# Altium footprint library ICs And Semiconductors SMD.PcbLib: 602 footprints (part 27 of 38)
Each footprint in its own frame and in the unit in brackets; x right, y up, seen from the top. Pads: shape width x height; smd on the part's side, far side on the other; paste and mask are expansions set on the pad; w line width, h text height; cw(c..) or ccw(c..) is an arc to the next point about the centre after c.
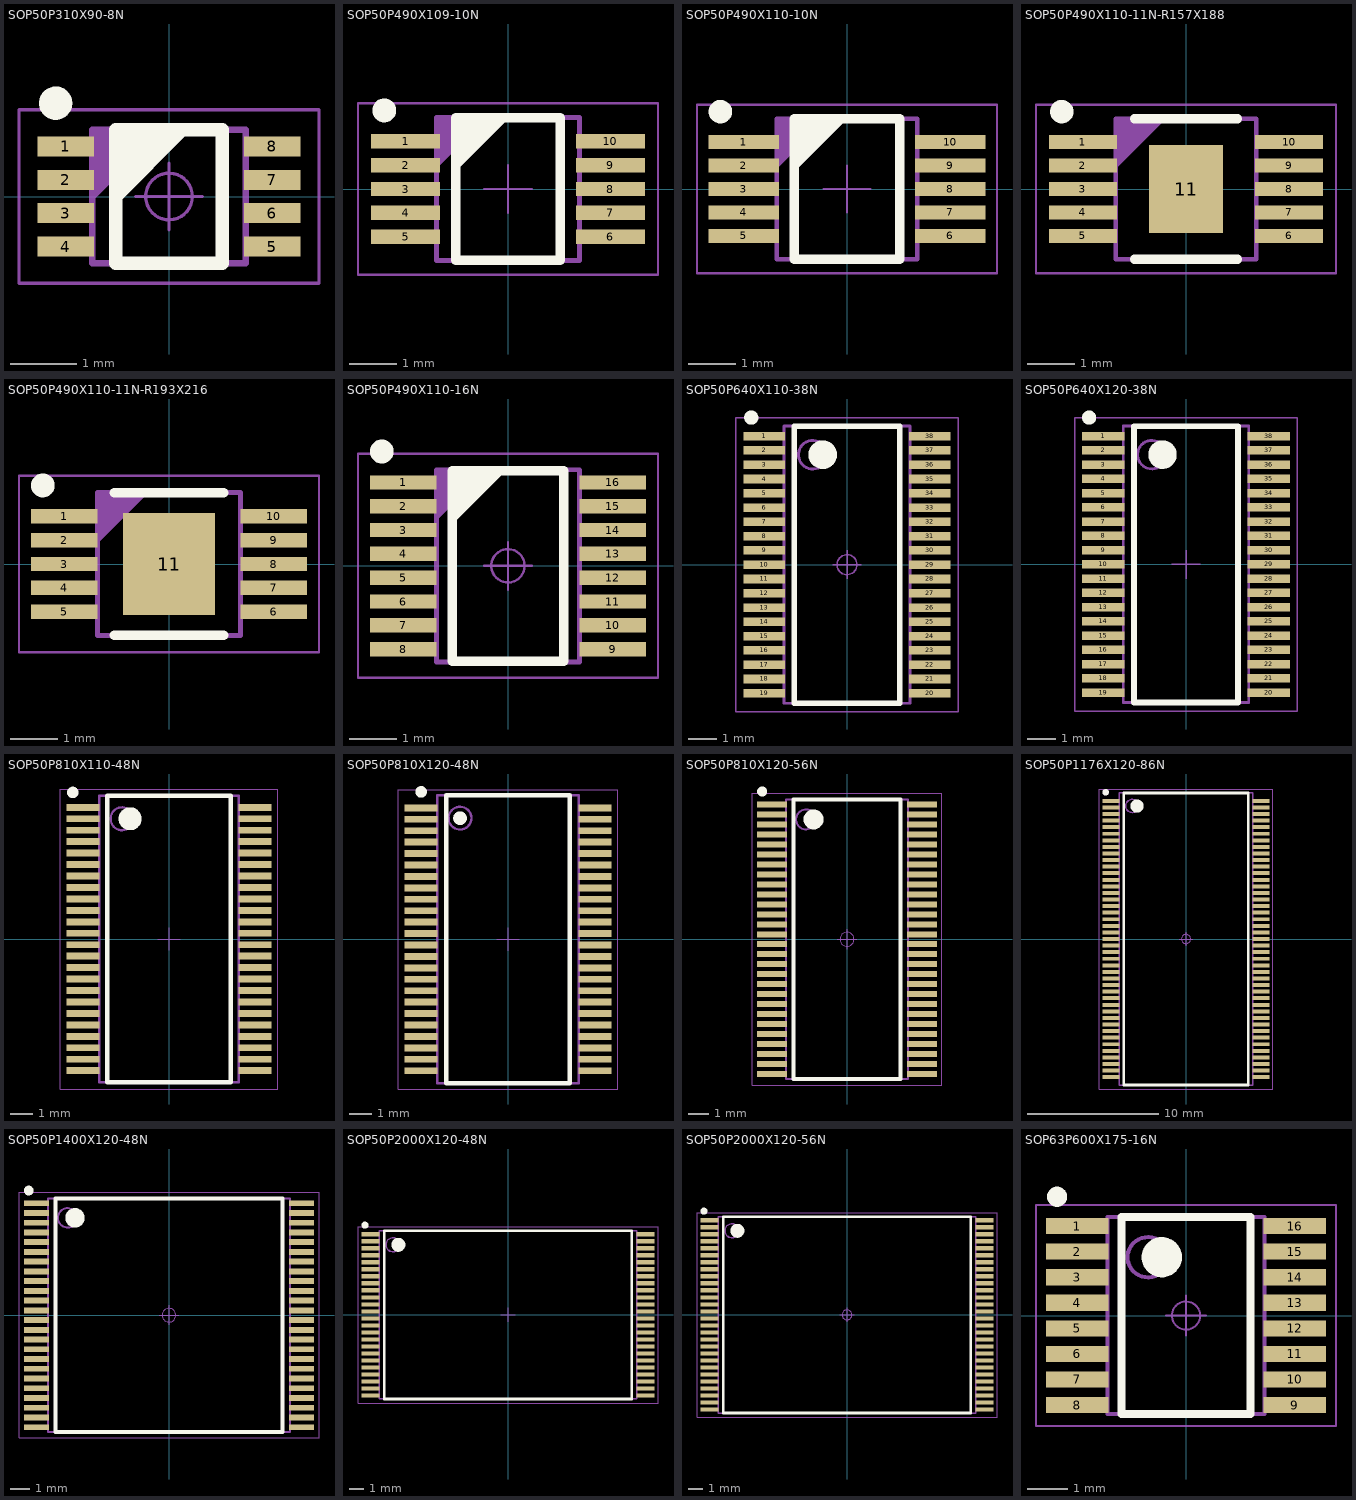
[diagram p26: the footprints below, top view; thin cyan lines are the x and y axes]

## SOP50P310X90-8N [mm] "SOP, 0.50mm pitch; 8 pin, 2.30mm W X 2.00mm L X 0.90mm H body, PC Medium Density"
height 0.9
pads (8):
  rect 0.85x0.3 smd: 1(-1.55,0.75) 2(-1.55,0.25) 3(-1.55,-0.25) 4(-1.55,-0.75) 5(1.55,-0.75) 6(1.55,-0.25) 7(1.55,0.25) 8(1.55,0.75)
Top Overlay:
  circle w0.25: c-1.7,1.4 r0.125
  lines w0.2: -0.8,0 0.2,1 ; -0.8,0.2 0,1 ; -0.8,0.4 -0.2,1 ; -0.8,0.6 -0.4,1 ; -0.8,0.8 -0.6,1 ; -0.8,-1 -0.8,1 0.8,1 0.8,-1 -0.8,-1
Mechanical 14:
  lines w0.1: -1.15,0 -0.15,1 ; -1.15,0.1 -0.25,1 ; -1.15,0.2 -0.35,1 ; -1.15,0.3 -0.45,1 ; -1.15,0.4 -0.55,1 ; -1.15,0.5 -0.65,1 ; -1.15,0.6 -0.75,1 ; -1.15,0.7 -0.85,1 ; -1.15,0.8 -0.95,1 ; -1.15,0.9 -1.05,1 ; -1.15,-1 -1.15,1 1.15,1 1.15,-1 -1.15,-1
Mechanical 15:
  circle w0.05: c0,0 r0.35
  lines w0.05: -0.5,0 0.5,0 ; 0,-0.5 0,0.5 ; -2.25,-1.3 -2.25,1.3 2.25,1.3 2.25,-1.3 -2.25,-1.3
3D body "SOP50P310X90-8N.stp": height 0.9, standoff 0, extent -1.616,-1 1.616,1

## SOP50P490X109-10N [mm] "SOP, 0.50mm pitch; 10 pin, 3.00mm W X 3.00mm L X 1.09mm H body, IPC Medium Density"
height 1.09
pads (10):
  rect 1.45x0.3 smd: 1(-2.15,1) 2(-2.15,0.5) 3(-2.15,0) 4(-2.15,-0.5) 5(-2.15,-1) 6(2.15,-1) 7(2.15,-0.5) 8(2.15,0) 9(2.15,0.5) 10(2.15,1)
Top Overlay:
  circle w0.25: c-2.6,1.65 r0.125
  lines w0.2: -1.1,0.5 -0.1,1.5 ; -1.1,0.7 -0.3,1.5 ; -1.1,0.9 -0.5,1.5 ; -1.1,1.1 -0.7,1.5 ; -1.1,1.3 -0.9,1.5 ; -1.1,-1.5 -1.1,1.5 1.1,1.5 1.1,-1.5 -1.1,-1.5
Mechanical 14:
  lines w0.1: -1.5,0.5 -0.5,1.5 ; -1.5,0.6 -0.6,1.5 ; -1.5,0.7 -0.7,1.5 ; -1.5,0.8 -0.8,1.5 ; -1.5,0.9 -0.9,1.5 ; -1.5,1 -1,1.5 ; -1.5,1.1 -1.1,1.5 ; -1.5,1.2 -1.2,1.5 ; -1.5,1.3 -1.3,1.5 ; -1.5,1.4 -1.4,1.5 ; -1.5,-1.5 -1.5,1.5 1.5,1.5 1.5,-1.5 -1.5,-1.5
Mechanical 15:
  lines w0.05: -0.5,0 0.5,0 ; 0,-0.5 0,0.5 ; -3.15,-1.8 3.15,-1.8 3.15,1.8 -3.15,1.8 -3.15,-1.8
3D body "SOP50P490X109-10N.stp": height 1.09, standoff 0, extent -2.45,-1.55 2.45,1.55

## SOP50P490X110-10N [mm] "TSSOP, 10-Leads, Body 3x3mm (max), Pitch 0.50mm, IPC Medium Density"
height 1.1
pads (10):
  rect 1.5x0.3 smd: 1(-2.2,1) 2(-2.2,0.5) 3(-2.2,0) 4(-2.2,-0.5) 5(-2.2,-1) 6(2.2,-1) 7(2.2,-0.5) 8(2.2,0) 9(2.2,0.5) 10(2.2,1)
Top Overlay:
  circle w0.25: c-2.7,1.65 r0.125
  lines w0.2: -1.125,0.5 -0.125,1.5 ; -1.125,0.7 -0.325,1.5 ; -1.125,0.9 -0.525,1.5 ; -1.125,1.1 -0.725,1.5 ; -1.125,1.3 -0.925,1.5 ; -1.125,-1.5 -1.125,1.5 1.125,1.5 1.125,-1.5 -1.125,-1.5
Mechanical 14:
  lines w0.1: -1.5,0.5 -0.5,1.5 ; -1.5,0.6 -0.6,1.5 ; -1.5,0.7 -0.7,1.5 ; -1.5,0.8 -0.8,1.5 ; -1.5,0.9 -0.9,1.5 ; -1.5,1 -1,1.5 ; -1.5,1.1 -1.1,1.5 ; -1.5,1.2 -1.2,1.5 ; -1.5,1.3 -1.3,1.5 ; -1.5,1.4 -1.4,1.5 ; -1.5,-1.5 -1.5,1.5 1.5,1.5 1.5,-1.5 -1.5,-1.5
Mechanical 15:
  lines w0.05: -0.5,0 0.5,0 ; 0,-0.5 0,0.5 ; -3.2,-1.8 3.2,-1.8 3.2,1.8 -3.2,1.8 -3.2,-1.8
3D body "SOP50P490X110-10N.stp": height 1.1, standoff 0, extent -2.45,-1.55 2.45,1.55

## SOP50P490X110-11N-R157X188 [mm] "SOP, 0.50mm, pitch; 10 pin, 3.00mm W X 3.00mm L X 1.10mm H body (w/thermal tab  1.57 X 1.88 mm), IPC Medium Density"
height 1.1
pads (11):
  rect 1.45x0.3 smd: 1(-2.2,1) 2(-2.2,0.5) 3(-2.2,0) 4(-2.2,-0.5) 5(-2.2,-1) 6(2.2,-1) 7(2.2,-0.5) 8(2.2,0) 9(2.2,0.5) 10(2.2,1)
  rect 1.57x1.88 smd: 11(0,0)
Top Overlay:
  circle w0.25: c-2.65,1.65 r0.125
  lines w0.2: -1.1,-1.5 1.1,-1.5 ; -1.1,1.5 1.1,1.5
Mechanical 14:
  lines w0.1: -1.5,0.5 -0.5,1.5 ; -1.5,0.6 -0.6,1.5 ; -1.5,0.7 -0.7,1.5 ; -1.5,0.8 -0.8,1.5 ; -1.5,0.9 -0.9,1.5 ; -1.5,1 -1,1.5 ; -1.5,1.1 -1.1,1.5 ; -1.5,1.2 -1.2,1.5 ; -1.5,1.3 -1.3,1.5 ; -1.5,1.4 -1.4,1.5 ; -1.5,-1.5 1.5,-1.5 1.5,1.5 -1.5,1.5 -1.5,-1.5
Mechanical 15:
  circle w0.05: c0,0 r0.35
  lines w0.05: -0.5,0 0.5,0 ; 0,-0.5 0,0.5 ; -3.2,-1.8 -3.2,1.8 3.2,1.8 3.2,-1.8 -3.2,-1.8
3D body "SOP50P490X110-11N-R155X185.stp": height 1.1, standoff 0, extent -2.45,-1.55 2.45,1.55

## SOP50P490X110-11N-R193X216 [mm] "SOP, 0.50mm, Pitch; 10 Pin, 3.00mm W X 3.00mm L X 1.10mm H Body (w/Thermal Tab  1.93 X 2.16 mm), IPC Medium Density"
height 1.1
pads (11):
  rect 1.4x0.3 smd: 1(-2.2,1) 2(-2.2,0.5) 3(-2.2,0) 4(-2.2,-0.5) 5(-2.2,-1) 6(2.2,-1) 7(2.2,-0.5) 8(2.2,0) 9(2.2,0.5) 10(2.2,1)
  rect 1.93x2.15 smd: 11(0,0)
Top Overlay:
  circle w0.25: c-2.65,1.65 r0.125
  lines w0.2: -1.15,-1.5 1.15,-1.5 ; -1.15,1.5 1.15,1.5
Mechanical 14:
  lines w0.1: -1.5,0.5 -0.5,1.5 ; -1.5,0.6 -0.6,1.5 ; -1.5,0.7 -0.7,1.5 ; -1.5,0.8 -0.8,1.5 ; -1.5,0.9 -0.9,1.5 ; -1.5,1 -1,1.5 ; -1.5,1.1 -1.1,1.5 ; -1.5,1.2 -1.2,1.5 ; -1.5,1.3 -1.3,1.5 ; -1.5,1.4 -1.4,1.5 ; -1.5,-1.5 -1.5,1.5 1.5,1.5 1.5,-1.5 -1.5,-1.5
Mechanical 15:
  circle w0.05: c0,0 r0.35
  lines w0.05: -0.5,0 0.5,0 ; 0,-0.5 0,0.5 ; -3.15,-1.85 3.15,-1.85 3.15,1.85 -3.15,1.85 -3.15,-1.85
3D body "SOP50P490X110-11N-R193X216.stp": height 1.1, standoff 0, extent -2.45,-1.55 2.45,1.55

## SOP50P490X110-16N [mm] "SOP, 0.50mm Pitch; 16 Pin, 3.00mm W X 4.039mm L X 1.10mm H Body, IPC Medium Density"
height 1.1
pads (16):
  rect 1.4x0.3 smd: 1(-2.2,1.75) 2(-2.2,1.25) 3(-2.2,0.75) 4(-2.2,0.25) 5(-2.2,-0.25) 6(-2.2,-0.75) 7(-2.2,-1.25) 8(-2.2,-1.75) 9(2.2,-1.75) 10(2.2,-1.25) 11(2.2,-0.75) 12(2.2,-0.25) 13(2.2,0.25) 14(2.2,0.75) 15(2.2,1.25) 16(2.2,1.75)
Top Overlay:
  circle w0.25: c-2.65,2.4 r0.125
  lines w0.2: -1.175,1 -0.175,2 ; -1.175,1.2 -0.375,2 ; -1.175,1.4 -0.575,2 ; -1.175,1.6 -0.775,2 ; -1.175,1.8 -0.975,2 ; -1.175,-2 1.175,-2 1.175,2 -1.175,2 -1.175,-2
Mechanical 14:
  lines w0.1: -1.5,1.019 -0.5,2.019 ; -1.5,1.12 -0.6,2.019 ; -1.5,1.219 -0.7,2.019 ; -1.5,1.32 -0.8,2.019 ; -1.5,1.419 -0.9,2.019 ; -1.5,1.519 -1,2.019 ; -1.5,1.62 -1.1,2.019 ; -1.5,1.719 -1.2,2.019 ; -1.5,1.82 -1.3,2.019 ; -1.5,1.919 -1.4,2.019 ; -1.5,-2.019 1.5,-2.019 1.5,2.019 -1.5,2.019 -1.5,-2.019
Mechanical 15:
  circle w0.05: c0,0 r0.35
  lines w0.05: -0.5,0 0.5,0 ; 0,-0.5 0,0.5 ; -3.15,-2.35 3.15,-2.35 3.15,2.35 -3.15,2.35 -3.15,-2.35
3D body "SOP50P490X110-16N.stp": height 1.1, standoff 0, extent -2.466,-2.07 2.466,2.07

## SOP50P640X110-38N [mm] "SOP, 0.50mm Pitch; 38 Pin, 4.40mm W X 9.70mm L X 1.10mm H Body, IPC Medium Density"
height 1.1
pads (38):
  rect 1.45x0.3 smd: 1(-2.9,4.5) 2(-2.9,4) 3(-2.9,3.5) 4(-2.9,3) 5(-2.9,2.5) 6(-2.9,2) 7(-2.9,1.5) 8(-2.9,1) 9(-2.9,0.5) 10(-2.9,0) 11(-2.9,-0.5) 12(-2.9,-1) 13(-2.9,-1.5) 14(-2.9,-2) 15(-2.9,-2.5) 16(-2.9,-3) 17(-2.9,-3.5) 18(-2.9,-4) 19(-2.9,-4.5) 20(2.9,-4.5) 21(2.9,-4) 22(2.9,-3.5) 23(2.9,-3) 24(2.9,-2.5) 25(2.9,-2) 26(2.9,-1.5) 27(2.9,-1) 28(2.9,-0.5) 29(2.9,0) 30(2.9,0.5) 31(2.9,1) 32(2.9,1.5) 33(2.9,2) 34(2.9,2.5) 35(2.9,3) 36(2.9,3.5) 37(2.9,4) 38(2.9,4.5)
Top Overlay:
  circle w0.5: c-0.85,3.85 r0.25
  circle w0.25: c-3.35,5.15 r0.125
  lines w0.2: -1.85,-4.85 1.85,-4.85 1.85,4.85 -1.85,4.85 -1.85,-4.85
Mechanical 14:
  circle w0.1: c-1.2,3.85 r0.5
  lines w0.1: -2.2,-4.85 2.2,-4.85 2.2,4.85 -2.2,4.85 -2.2,-4.85
Mechanical 15:
  circle w0.05: c0,0 r0.35
  lines w0.05: -0.5,0 0.5,0 ; 0,-0.5 0,0.5 ; -3.9,-5.15 3.9,-5.15 3.9,5.15 -3.9,5.15 -3.9,-5.15
3D body "SOP50P640X110-38N.stp": height 1.1, standoff 0, extent -3.319,-4.9 3.32,4.9

## SOP50P640X120-38N [mm] "SOP, 0.50mm pitch; 38 pin, 4.40mm W X 9.70mm L X 1.20mm H body, IPC Medium Density"
height 1.2
pads (38):
  rect 1.5x0.3 smd: 1(-2.9,4.5) 2(-2.9,4) 3(-2.9,3.5) 4(-2.9,3) 5(-2.9,2.5) 6(-2.9,2) 7(-2.9,1.5) 8(-2.9,1) 9(-2.9,0.5) 10(-2.9,0) 11(-2.9,-0.5) 12(-2.9,-1) 13(-2.9,-1.5) 14(-2.9,-2) 15(-2.9,-2.5) 16(-2.9,-3) 17(-2.9,-3.5) 18(-2.9,-4) 19(-2.9,-4.5) 20(2.9,-4.5) 21(2.9,-4) 22(2.9,-3.5) 23(2.9,-3) 24(2.9,-2.5) 25(2.9,-2) 26(2.9,-1.5) 27(2.9,-1) 28(2.9,-0.5) 29(2.9,0) 30(2.9,0.5) 31(2.9,1) 32(2.9,1.5) 33(2.9,2) 34(2.9,2.5) 35(2.9,3) 36(2.9,3.5) 37(2.9,4) 38(2.9,4.5)
Top Overlay:
  circle w0.5: c-0.825,3.85 r0.25
  circle w0.25: c-3.4,5.15 r0.125
  lines w0.2: -1.825,-4.85 1.825,-4.85 1.825,4.85 -1.825,4.85 -1.825,-4.85
Mechanical 14:
  circle w0.1: c-1.2,3.85 r0.5
  lines w0.1: -2.2,-4.85 2.2,-4.85 2.2,4.85 -2.2,4.85 -2.2,-4.85
Mechanical 15:
  lines w0.05: -0.5,0 0.5,0 ; 0,-0.5 0,0.5 ; -3.9,-5.15 3.9,-5.15 3.9,5.15 -3.9,5.15 -3.9,-5.15
3D body "SOP50P640X120-38N.stp": height 1.2, standoff 0, extent -3.32,-4.9 3.32,4.9

## SOP50P810X110-48N [mm] "SOP, 48-Leads, Body 12.5x6.2mm (max), Pitch 0.50mm, IPC Medium Density"
height 1.1
pads (48):
  rect 1.45x0.3 smd: 1(-3.75,5.75) 2(-3.75,5.25) 3(-3.75,4.75) 4(-3.75,4.25) 5(-3.75,3.75) 6(-3.75,3.25) 7(-3.75,2.75) 8(-3.75,2.25) 9(-3.75,1.75) 10(-3.75,1.25) 11(-3.75,0.75) 12(-3.75,0.25) 13(-3.75,-0.25) 14(-3.75,-0.75) 15(-3.75,-1.25) 16(-3.75,-1.75) 17(-3.75,-2.25) 18(-3.75,-2.75) 19(-3.75,-3.25) 20(-3.75,-3.75) 21(-3.75,-4.25) 22(-3.75,-4.75) 23(-3.75,-5.25) 24(-3.75,-5.75) 25(3.75,-5.75) 26(3.75,-5.25) 27(3.75,-4.75) 28(3.75,-4.25) 29(3.75,-3.75) 30(3.75,-3.25) 31(3.75,-2.75) 32(3.75,-2.25) 33(3.75,-1.75) 34(3.75,-1.25) 35(3.75,-0.75) 36(3.75,-0.25) 37(3.75,0.25) 38(3.75,0.75) 39(3.75,1.25) 40(3.75,1.75) 41(3.75,2.25) 42(3.75,2.75) 43(3.75,3.25) 44(3.75,3.75) 45(3.75,4.25) 46(3.75,4.75) 47(3.75,5.25) 48(3.75,5.75)
Top Overlay:
  circle w0.5: c-1.7,5.25 r0.25
  circle w0.25: c-4.2,6.4 r0.125
  lines w0.2: -2.7,-6.25 2.7,-6.25 2.7,6.25 -2.7,6.25 -2.7,-6.25
Mechanical 14:
  circle w0.1: c-2.05,5.25 r0.5
  lines w0.1: -3.05,-6.25 -3.05,6.25 3.05,6.25 3.05,-6.25 -3.05,-6.25
Mechanical 15:
  lines w0.05: -0.5,0 0.5,0 ; 0,-0.5 0,0.5 ; -4.75,-6.55 -4.75,6.55 4.75,6.55 4.75,-6.55 -4.75,-6.55
3D body "SOP50P810X110-48N.stp": height 1.1, standoff 0, extent -4.06,-6.3 4.061,6.3

## SOP50P810X120-48N [mm] "SOP, 48-Leads, Body 12.6x6.2mm (max), Pitch 0.50mm, IPC Medium Density"
height 1.2
pads (48):
  rect 1.45x0.3 smd: 1(-3.8,5.75) 2(-3.8,5.25) 3(-3.8,4.75) 4(-3.8,4.25) 5(-3.8,3.75) 6(-3.8,3.25) 7(-3.8,2.75) 8(-3.8,2.25) 9(-3.8,1.75) 10(-3.8,1.25) 11(-3.8,0.75) 12(-3.8,0.25) 13(-3.8,-0.25) 14(-3.8,-0.75) 15(-3.8,-1.25) 16(-3.8,-1.75) 17(-3.8,-2.25) 18(-3.8,-2.75) 19(-3.8,-3.25) 20(-3.8,-3.75) 21(-3.8,-4.25) 22(-3.8,-4.75) 23(-3.8,-5.25) 24(-3.8,-5.75) 25(3.8,-5.75) 26(3.8,-5.25) 27(3.8,-4.75) 28(3.8,-4.25) 29(3.8,-3.75) 30(3.8,-3.25) 31(3.8,-2.75) 32(3.8,-2.25) 33(3.8,-1.75) 34(3.8,-1.25) 35(3.8,-0.75) 36(3.8,-0.25) 37(3.8,0.25) 38(3.8,0.75) 39(3.8,1.25) 40(3.8,1.75) 41(3.8,2.25) 42(3.8,2.75) 43(3.8,3.25) 44(3.8,3.75) 45(3.8,4.25) 46(3.8,4.75) 47(3.8,5.25) 48(3.8,5.75)
Top Overlay:
  circle w0.3: c-2.1,5.3 r0.15
  circle w0.25: c-3.8,6.45 r0.125
  lines w0.2: -2.7,-6.3 -2.7,6.3 2.7,6.3 2.7,-6.3 -2.7,-6.3
Mechanical 14:
  circle w0.1: c-2.1,5.3 r0.5
  lines w0.1: -3.1,-6.3 -3.1,6.3 3.1,6.3 3.1,-6.3 -3.1,-6.3
Mechanical 15:
  lines w0.05: -0.5,0 0.5,0 ; 0,-0.5 0,0.5 ; -4.8,-6.55 -4.8,6.55 4.8,6.55 4.8,-6.55 -4.8,-6.55
3D body "SOP50P810X120-48N.stp": height 1.2, standoff 0, extent -4.06,-6.3 4.061,6.3

## SOP50P810X120-56N [mm] "SOP, 0.50mm Pitch; 56 Pin,6.10mm W X 14.00mm L X 1.20mm H Body, IPC Medium Density"
height 1.2
pads (56):
  rect 1.5x0.3 smd: 1(-3.75,6.75) 2(-3.75,6.25) 3(-3.75,5.75) 4(-3.75,5.25) 5(-3.75,4.75) 6(-3.75,4.25) 7(-3.75,3.75) 8(-3.75,3.25) 9(-3.75,2.75) 10(-3.75,2.25) 11(-3.75,1.75) 12(-3.75,1.25) 13(-3.75,0.75) 14(-3.75,0.25) 15(-3.75,-0.25) 16(-3.75,-0.75) 17(-3.75,-1.25) 18(-3.75,-1.75) 19(-3.75,-2.25) 20(-3.75,-2.75) 21(-3.75,-3.25) 22(-3.75,-3.75) 23(-3.75,-4.25) 24(-3.75,-4.75) 25(-3.75,-5.25) 26(-3.75,-5.75) 27(-3.75,-6.25) 28(-3.75,-6.75) 29(3.75,-6.75) 30(3.75,-6.25) 31(3.75,-5.75) 32(3.75,-5.25) 33(3.75,-4.75) 34(3.75,-4.25) 35(3.75,-3.75) 36(3.75,-3.25) 37(3.75,-2.75) 38(3.75,-2.25) 39(3.75,-1.75) 40(3.75,-1.25) 41(3.75,-0.75) 42(3.75,-0.25) 43(3.75,0.25) 44(3.75,0.75) 45(3.75,1.25) 46(3.75,1.75) 47(3.75,2.25) 48(3.75,2.75) 49(3.75,3.25) 50(3.75,3.75) 51(3.75,4.25) 52(3.75,4.75) 53(3.75,5.25) 54(3.75,5.75) 55(3.75,6.25) 56(3.75,6.75)
Top Overlay:
  circle w0.5: c-1.675,6 r0.25
  circle w0.25: c-4.25,7.4 r0.125
  lines w0.2: -2.675,-7 2.675,-7 2.675,7 -2.675,7 -2.675,-7
Mechanical 14:
  circle w0.1: c-2.05,6 r0.5
  lines w0.1: -3.05,-7 3.05,-7 3.05,7 -3.05,7 -3.05,-7
Mechanical 15:
  circle w0.05: c0,0 r0.35
  lines w0.05: -0.5,0 0.5,0 ; 0,-0.5 0,0.5 ; -4.75,-7.3 4.75,-7.3 4.75,7.3 -4.75,7.3 -4.75,-7.3
3D body "SOP50P810X120-56N.stp": height 1.2, standoff 0, extent -4.06,-7.05 4.061,7.05

## SOP50P1176X120-86N [mm] "SOP, 0.50mm, pitch; 86 pin, 10.16mm W X 22.22mm L X 1.20mm H body, IPC Medium Density"
height 1.2
pads (86):
  rect 1.3x0.3 smd: 1(-5.7,10.5) 2(-5.7,10) 3(-5.7,9.5) 4(-5.7,9) 5(-5.7,8.5) 6(-5.7,8) 7(-5.7,7.5) 8(-5.7,7) 9(-5.7,6.5) 10(-5.7,6) 11(-5.7,5.5) 12(-5.7,5) 13(-5.7,4.5) 14(-5.7,4) 15(-5.7,3.5) 16(-5.7,3) 17(-5.7,2.5) 18(-5.7,2) 19(-5.7,1.5) 20(-5.7,1) 21(-5.7,0.5) 22(-5.7,0) 23(-5.7,-0.5) 24(-5.7,-1) 25(-5.7,-1.5) 26(-5.7,-2) 27(-5.7,-2.5) 28(-5.7,-3) 29(-5.7,-3.5) 30(-5.7,-4) 31(-5.7,-4.5) 32(-5.7,-5) 33(-5.7,-5.5) 34(-5.7,-6) 35(-5.7,-6.5) 36(-5.7,-7) 37(-5.7,-7.5) 38(-5.7,-8) 39(-5.7,-8.5) 40(-5.7,-9) 41(-5.7,-9.5) 42(-5.7,-10) 43(-5.7,-10.5) 44(5.7,-10.5) 45(5.7,-10) 46(5.7,-9.5) 47(5.7,-9) 48(5.7,-8.5) 49(5.7,-8) 50(5.7,-7.5) 51(5.7,-7) 52(5.7,-6.5) 53(5.7,-6) 54(5.7,-5.5) 55(5.7,-5) 56(5.7,-4.5) 57(5.7,-4) 58(5.7,-3.5) 59(5.7,-3) 60(5.7,-2.5) 61(5.7,-2) 62(5.7,-1.5) 63(5.7,-1) 64(5.7,-0.5) 65(5.7,0) 66(5.7,0.5) 67(5.7,1) 68(5.7,1.5) 69(5.7,2) 70(5.7,2.5) 71(5.7,3) 72(5.7,3.5) 73(5.7,4) 74(5.7,4.5) 75(5.7,5) 76(5.7,5.5) 77(5.7,6) 78(5.7,6.5) 79(5.7,7) 80(5.7,7.5) 81(5.7,8) 82(5.7,8.5) 83(5.7,9) 84(5.7,9.5) 85(5.7,10) 86(5.7,10.5)
Top Overlay:
  circle w0.5: c-3.725,10.1 r0.25
  circle w0.25: c-6.1,11.15 r0.125
  lines w0.2: -4.725,-11.1 4.725,-11.1 4.725,11.1 -4.725,11.1 -4.725,-11.1
Mechanical 14:
  circle w0.1: c-4.08,10.11 r0.5
  lines w0.1: -5.08,-11.11 5.08,-11.11 5.08,11.11 -5.08,11.11 -5.08,-11.11
Mechanical 15:
  circle w0.05: c0,0 r0.35
  lines w0.05: -0.5,0 0.5,0 ; 0,-0.5 0,0.5 ; -6.6,-11.4 6.6,-11.4 6.6,11.4 -6.6,11.4 -6.6,-11.4
3D body "SOP50P1176X120-86N.stp": height 1.2, standoff 0, extent -5.97,-11.15 5.97,11.15

## SOP50P1400X120-48N [mm] "SOP, 0.50mm Pitch; 48 Pin, 12.40mm W X 12.00mm L X 1.20mm H body, IPC Medium Density"
height 1.2
pads (48):
  rect 1.3x0.3 smd: 1(-6.8,5.75) 2(-6.8,5.25) 3(-6.8,4.75) 4(-6.8,4.25) 5(-6.8,3.75) 6(-6.8,3.25) 7(-6.8,2.75) 8(-6.8,2.25) 9(-6.8,1.75) 10(-6.8,1.25) 11(-6.8,0.75) 12(-6.8,0.25) 13(-6.8,-0.25) 14(-6.8,-0.75) 15(-6.8,-1.25) 16(-6.8,-1.75) 17(-6.8,-2.25) 18(-6.8,-2.75) 19(-6.8,-3.25) 20(-6.8,-3.75) 21(-6.8,-4.25) 22(-6.8,-4.75) 23(-6.8,-5.25) 24(-6.8,-5.75) 25(6.8,-5.75) 26(6.8,-5.25) 27(6.8,-4.75) 28(6.8,-4.25) 29(6.8,-3.75) 30(6.8,-3.25) 31(6.8,-2.75) 32(6.8,-2.25) 33(6.8,-1.75) 34(6.8,-1.25) 35(6.8,-0.75) 36(6.8,-0.25) 37(6.8,0.25) 38(6.8,0.75) 39(6.8,1.25) 40(6.8,1.75) 41(6.8,2.25) 42(6.8,2.75) 43(6.8,3.25) 44(6.8,3.75) 45(6.8,4.25) 46(6.8,4.75) 47(6.8,5.25) 48(6.8,5.75)
Top Overlay:
  circle w0.25: c-7.2,6.4 r0.125
  circle w0.5: c-4.825,5 r0.25
  lines w0.2: -5.825,-6 -5.825,6 5.825,6 5.825,-6 -5.825,-6
Mechanical 14:
  circle w0.1: c-5.2,5 r0.5
  lines w0.1: -6.2,-6 -6.2,6 6.2,6 6.2,-6 -6.2,-6
Mechanical 15:
  circle w0.05: c0,0 r0.35
  lines w0.05: -0.5,0 0.5,0 ; 0,-0.5 0,0.5 ; -7.7,-6.3 -7.7,6.3 7.7,6.3 7.7,-6.3 -7.7,-6.3
3D body "SOP50P1400X120-48N.stp": height 1.2, standoff 0, extent -7.061,-6 7.061,6

## SOP50P2000X120-48N [mm] "SOP, 48-Leads, Body 18.45x12mm, Pitch 0.50mm, IPC Medium Density"
height 1.2
pads (48):
  rect 1.3x0.3 smd: 1(-9.8,5.75) 2(-9.8,5.25) 3(-9.8,4.75) 4(-9.8,4.25) 5(-9.8,3.75) 6(-9.8,3.25) 7(-9.8,2.75) 8(-9.8,2.25) 9(-9.8,1.75) 10(-9.8,1.25) 11(-9.8,0.75) 12(-9.8,0.25) 13(-9.8,-0.25) 14(-9.8,-0.75) 15(-9.8,-1.25) 16(-9.8,-1.75) 17(-9.8,-2.25) 18(-9.8,-2.75) 19(-9.8,-3.25) 20(-9.8,-3.75) 21(-9.8,-4.25) 22(-9.8,-4.75) 23(-9.8,-5.25) 24(-9.8,-5.75) 25(9.8,-5.75) 26(9.8,-5.25) 27(9.8,-4.75) 28(9.8,-4.25) 29(9.8,-3.75) 30(9.8,-3.25) 31(9.8,-2.75) 32(9.8,-2.25) 33(9.8,-1.75) 34(9.8,-1.25) 35(9.8,-0.75) 36(9.8,-0.25) 37(9.8,0.25) 38(9.8,0.75) 39(9.8,1.25) 40(9.8,1.75) 41(9.8,2.25) 42(9.8,2.75) 43(9.8,3.25) 44(9.8,3.75) 45(9.8,4.25) 46(9.8,4.75) 47(9.8,5.25) 48(9.8,5.75)
Top Overlay:
  circle w0.5: c-7.825,5 r0.25
  circle w0.25: c-10.2,6.4 r0.125
  lines w0.2: -8.825,-6 8.825,-6 8.825,6 -8.825,6 -8.825,-6
Mechanical 14:
  circle w0.1: c-8.2,5 r0.5
  lines w0.1: -9.2,-6 -9.2,6 9.2,6 9.2,-6 -9.2,-6
Mechanical 15:
  lines w0.05: -0.5,0 0.5,0 ; 0,-0.5 0,0.5 ; -10.7,-6.3 -10.7,6.3 10.7,6.3 10.7,-6.3 -10.7,-6.3
3D body "SOP50P2000X120-48N.stp": height 1.2, standoff 0, extent -10.12,-6.05 10.121,6.05

## SOP50P2000X120-56N [mm] "SOP, 0.50mm, Pitch; 56 Pin, 18.40mm W X 14.00mm L X 1.20mm H body, IPC Medium Density"
height 1.2
pads (56):
  rect 1.3x0.3 smd: 1(-9.8,6.75) 2(-9.8,6.25) 3(-9.8,5.75) 4(-9.8,5.25) 5(-9.8,4.75) 6(-9.8,4.25) 7(-9.8,3.75) 8(-9.8,3.25) 9(-9.8,2.75) 10(-9.8,2.25) 11(-9.8,1.75) 12(-9.8,1.25) 13(-9.8,0.75) 14(-9.8,0.25) 15(-9.8,-0.25) 16(-9.8,-0.75) 17(-9.8,-1.25) 18(-9.8,-1.75) 19(-9.8,-2.25) 20(-9.8,-2.75) 21(-9.8,-3.25) 22(-9.8,-3.75) 23(-9.8,-4.25) 24(-9.8,-4.75) 25(-9.8,-5.25) 26(-9.8,-5.75) 27(-9.8,-6.25) 28(-9.8,-6.75) 29(9.8,-6.75) 30(9.8,-6.25) 31(9.8,-5.75) 32(9.8,-5.25) 33(9.8,-4.75) 34(9.8,-4.25) 35(9.8,-3.75) 36(9.8,-3.25) 37(9.8,-2.75) 38(9.8,-2.25) 39(9.8,-1.75) 40(9.8,-1.25) 41(9.8,-0.75) 42(9.8,-0.25) 43(9.8,0.25) 44(9.8,0.75) 45(9.8,1.25) 46(9.8,1.75) 47(9.8,2.25) 48(9.8,2.75) 49(9.8,3.25) 50(9.8,3.75) 51(9.8,4.25) 52(9.8,4.75) 53(9.8,5.25) 54(9.8,5.75) 55(9.8,6.25) 56(9.8,6.75)
Top Overlay:
  circle w0.5: c-7.825,6 r0.25
  circle w0.25: c-10.2,7.4 r0.125
  lines w0.2: -8.825,-7 8.825,-7 8.825,7 -8.825,7 -8.825,-7
Mechanical 14:
  circle w0.1: c-8.2,6 r0.5
  lines w0.1: -9.2,-7 9.2,-7 9.2,7 -9.2,7 -9.2,-7
Mechanical 15:
  circle w0.05: c0,0 r0.35
  lines w0.05: -0.5,0 0.5,0 ; 0,-0.5 0,0.5 ; -10.7,-7.3 10.7,-7.3 10.7,7.3 -10.7,7.3 -10.7,-7.3
3D body "SOP50P2000X120-56N.stp": height 1.2, standoff 0, extent -10.12,-7.05 10.121,7.05

## SOP63P600X175-16N [mm] "SOP, 0.635mm pitch; 16 pin, 3.9mm W X 4.895mm L X 1.75mm H Body, IPC Medium Density"
height 1.75
pads (16):
  rect 1.55x0.4 smd: 1(-2.7,2.222) 2(-2.7,1.587) 3(-2.7,0.953) 4(-2.7,0.318) 5(-2.7,-0.318) 6(-2.7,-0.953) 7(-2.7,-1.587) 8(-2.7,-2.222) 9(2.7,-2.222) 10(2.7,-1.587) 11(2.7,-0.953) 12(2.7,-0.318) 13(2.7,0.318) 14(2.7,0.953) 15(2.7,1.587) 16(2.7,2.222)
Top Overlay:
  circle w0.25: c-3.2,2.95 r0.125
  circle w0.5: c-0.6,1.45 r0.25
  lines w0.2: -1.6,-2.45 -1.6,2.45 1.6,2.45 1.6,-2.45 -1.6,-2.45
Mechanical 14:
  circle w0.1: c-0.95,1.448 r0.5
  lines w0.1: -1.95,-2.448 -1.95,2.448 1.95,2.448 1.95,-2.448 -1.95,-2.448
Mechanical 15:
  circle w0.05: c0,0 r0.35
  lines w0.05: -0.5,0 0.5,0 ; 0,-0.5 0,0.5 ; -3.725,-2.745 -3.725,2.745 3.725,2.745 3.725,-2.745 -3.725,-2.745
3D body "SOP63P600X175-16N.stp": height 1.75, standoff 0, extent -3.127,-2.49 3.127,2.49